# Altium integrated library WE_WR-PHD_Socket Header_2.54mm_rev15c.IntLib: 197 symbols (part 2 of 2) (continued)
## WE-2.54 mm Socket Header 613032243121 (continued)
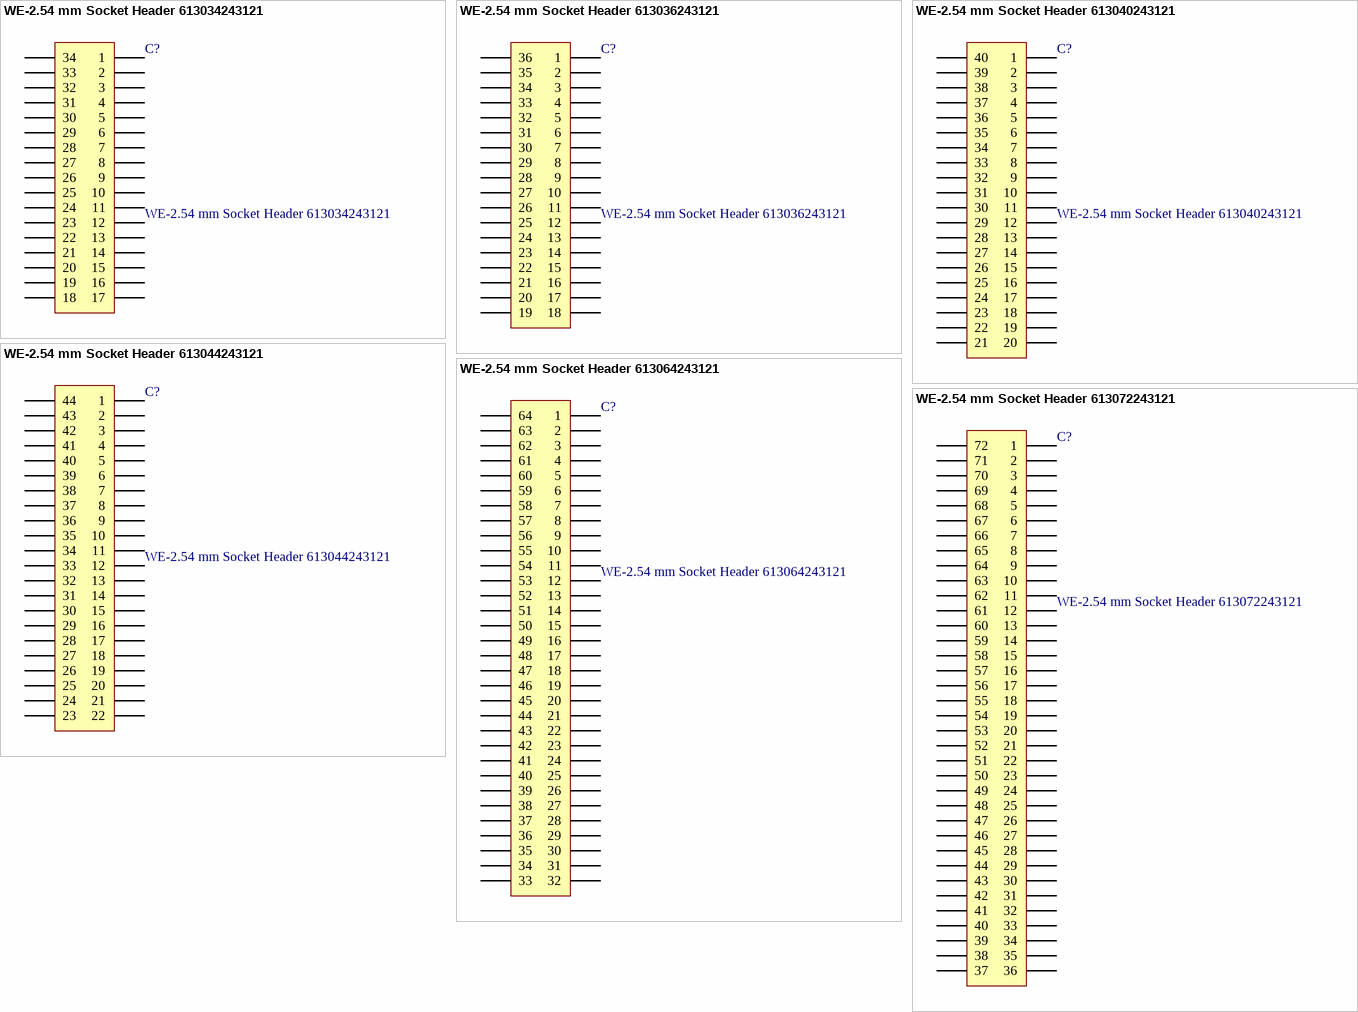
[diagram p15: symbols WE-2.54 mm Socket Header 613034243121 to WE-2.54 mm Socket Header 613072243121]

## WE-2.54 mm Socket Header 613034243121
designator C?
WR-PHD 2.54 mm Angled Socket Header; Manufacturer: Würth Elektronik eiSos GmbH; ComponentLink1 Description: Manufacturer; ComponentLink2 Description: Datasheet; NoPins: 34; Created Date: 29 March 2013; partNo: 613034243121; ComponentLink1URL: http://www.we-online.com; ComponentLink2URL: http://katalog.we-online.de/em/datasheet/6130xx243121.pdf; Created by: Karrer Zheng
footprint 613034243121 (34p 2 rows Right angle)
pins: 1, 2, 3, 4, 5, 6, 7, 8, 9, 10, 11, 12, 13, 14, 15, 16, 17, 18, 19, 20, 21, 22, 23, 24, 25, 26, 27, 28, 29, 30, 31, 32, 33, 34

## WE-2.54 mm Socket Header 613036243121
designator C?
WR-PHD 2.54 mm Angled Socket Header; Manufacturer: Würth Elektronik eiSos GmbH; ComponentLink1 Description: Manufacturer; ComponentLink2 Description: Datasheet; NoPins: 36; Created Date: 29 March 2013; partNo: 613036243121; ComponentLink1URL: http://www.we-online.com; ComponentLink2URL: http://katalog.we-online.de/em/datasheet/6130xx243121.pdf; Created by: Karrer Zheng
footprint 613036243121 (36p 2 rows Right angle)
pins: 1, 2, 3, 4, 5, 6, 7, 8, 9, 10, 11, 12, 13, 14, 15, 16, 17, 18, 19, 20, 21, 22, 23, 24, 25, 26, 27, 28, 29, 30, 31, 32, 33, 34, 35, 36

## WE-2.54 mm Socket Header 613040243121
designator C?
WR-PHD 2.54 mm Angled Socket Header; Manufacturer: Würth Elektronik eiSos GmbH; ComponentLink1 Description: Manufacturer; ComponentLink2 Description: Datasheet; NoPins: 40; Created Date: 29 March 2013; partNo: 613040243121; ComponentLink1URL: http://www.we-online.com; ComponentLink2URL: http://katalog.we-online.de/em/datasheet/6130xx243121.pdf; Created by: Karrer Zheng
footprint 613040243121 (40p 2 rows Right angle)
pins: 1, 2, 3, 4, 5, 6, 7, 8, 9, 10, 11, 12, 13, 14, 15, 16, 17, 18, 19, 20, 21, 22, 23, 24, 25, 26, 27, 28, 29, 30, 31, 32, 33, 34, 35, 36, 37, 38, 39, 40

## WE-2.54 mm Socket Header 613044243121
designator C?
WR-PHD 2.54 mm Angled Socket Header; Manufacturer: Würth Elektronik eiSos GmbH; ComponentLink1 Description: Manufacturer; ComponentLink2 Description: Datasheet; NoPins: 44; Created Date: 29 March 2013; partNo: 613044243121; ComponentLink1URL: http://www.we-online.com; ComponentLink2URL: http://katalog.we-online.de/em/datasheet/6130xx243121.pdf; Created by: Karrer Zheng
footprint 613044243121 (44p 2 rows Right angle)
pins: 1, 2, 3, 4, 5, 6, 7, 8, 9, 10, 11, 12, 13, 14, 15, 16, 17, 18, 19, 20, 21, 22, 23, 24, 25, 26, 27, 28, 29, 30, 31, 32, 33, 34, 35, 36, 37, 38, 39, 40, 41, 42, 43, 44

## WE-2.54 mm Socket Header 613064243121
designator C?
WR-PHD 2.54 mm Angled Socket Header; Manufacturer: Würth Elektronik eiSos GmbH; ComponentLink1 Description: Manufacturer; ComponentLink2 Description: Datasheet; NoPins: 64; Created Date: 29 March 2013; partNo: 613064243121; ComponentLink1URL: http://www.we-online.com; ComponentLink2URL: http://katalog.we-online.de/em/datasheet/6130xx243121.pdf; Created by: Karrer Zheng
footprint 613064243121 (64p 2 rows Right angle)
pins: 1, 2, 3, 4, 5, 6, 7, 8, 9, 10, 11, 12, 13, 14, 15, 16, 17, 18, 19, 20, 21, 22, 23, 24, 25, 26, 27, 28, 29, 30, 31, 32, 33, 34, 35, 36, 37, 38, 39, 40, 41, 42, 43, 44, 45, 46, 47, 48, 49, 50, 51, 52, 53, 54, 55, 56, 57, 58, 59, 60, 61, 62, 63, 64

## WE-2.54 mm Socket Header 613072243121
designator C?
WR-PHD 2.54 mm Angled Socket Header; Manufacturer: Würth Elektronik eiSos GmbH; ComponentLink1 Description: Manufacturer; ComponentLink2 Description: Datasheet; NoPins: 72; Created Date: 29 March 2013; partNo: 613072243121; ComponentLink1URL: http://www.we-online.com; ComponentLink2URL: http://katalog.we-online.de/em/datasheet/6130xx243121.pdf; Created by: Karrer Zheng
footprint 613072243121 (72p 2 rows Right angle)
pins: 1, 2, 3, 4, 5, 6, 7, 8, 9, 10, 11, 12, 13, 14, 15, 16, 17, 18, 19, 20, 21, 22, 23, 24, 25, 26, 27, 28, 29, 30, 31, 32, 33, 34, 35, 36, 37, 38, 39, 40, 41, 42, 43, 44, 45, 46, 47, 48, 49, 50, 51, 52, 53, 54, 55, 56, 57, 58, 59, 60, 61, 62, 63, 64, 65, 66, 67, 68, 69, 70, 71, 72


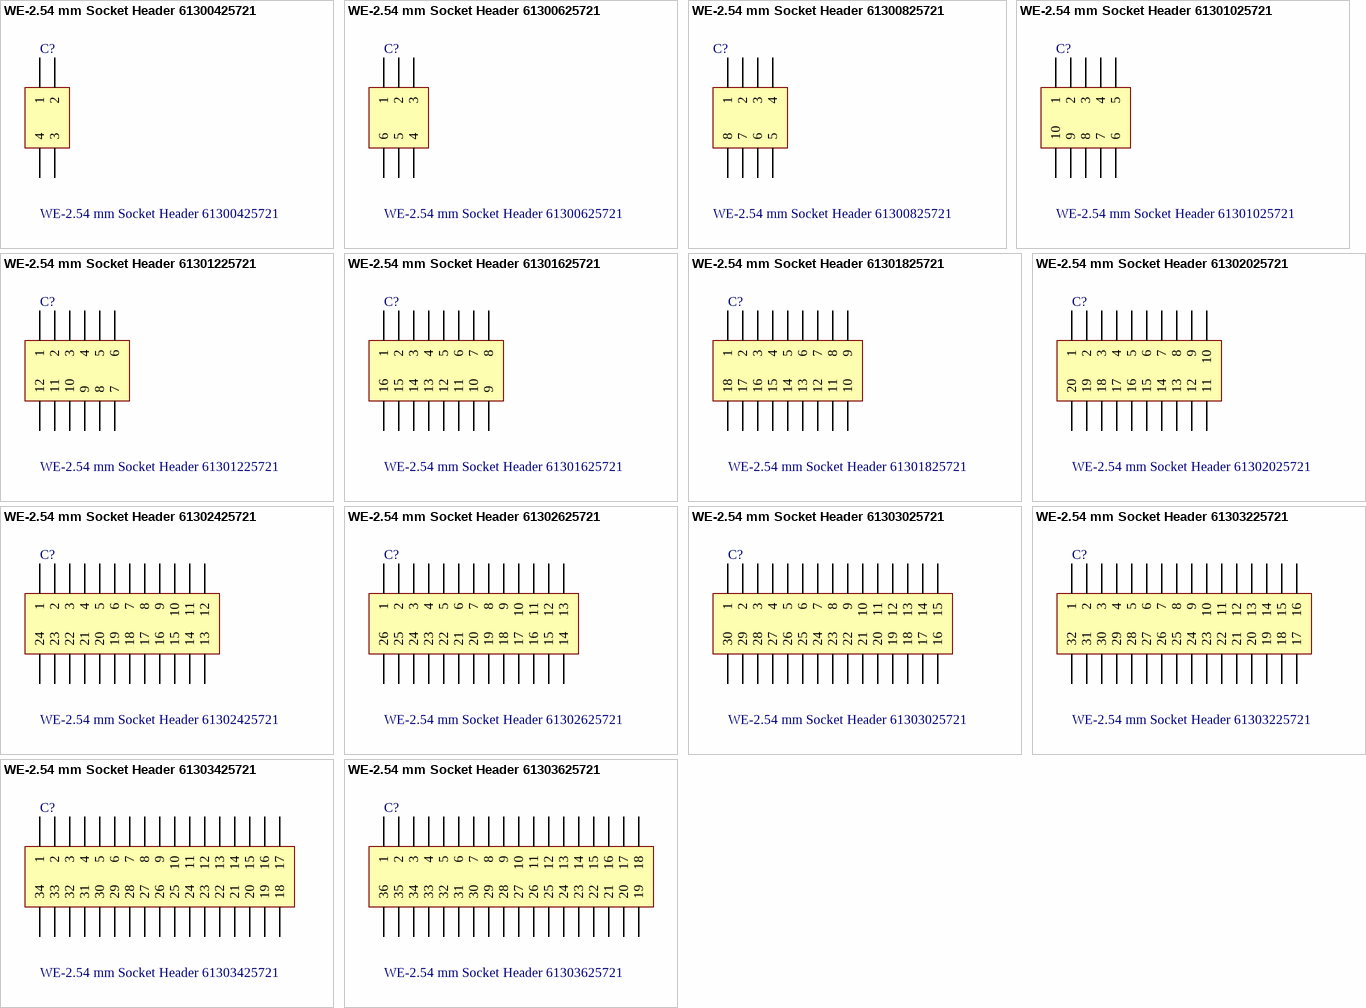
[diagram p16: symbols WE-2.54 mm Socket Header 61300425721 to WE-2.54 mm Socket Header 61303625721]

## WE-2.54 mm Socket Header 61300425721
designator C?
WR-PHD 2.54 mm Dual Socket Header Bottom Entry; Manufacturer: Würth Elektronik eiSos GmbH; ComponentLink1 Description: Manufacturer; ComponentLink2 Description: Datasheet; NoPins: 04; Created Date: 29 March 2013; partNo: 61300425721; ComponentLink1URL: http://www.we-online.com; ComponentLink2URL: http://katalog.we-online.de/em/datasheet/6130xx25721.pdf; Created by: Karrer Zheng
footprint 61300425721 (4 pins, dual row, straight, gold plating)
pins: 1, 2, 3, 4

## WE-2.54 mm Socket Header 61300625721
designator C?
WR-PHD 2.54 mm Dual Socket Header Bottom Entry; Manufacturer: Würth Elektronik eiSos GmbH; ComponentLink1 Description: Manufacturer; ComponentLink2 Description: Datasheet; NoPins: 06; Created Date: 29 March 2013; partNo: 61300625721; ComponentLink1URL: http://www.we-online.com; ComponentLink2URL: http://katalog.we-online.de/em/datasheet/6130xx25721.pdf; Created by: Karrer Zheng
footprint 61300625721 (6 pins, dual row, straight, gold plating)
pins: 1, 2, 3, 4, 5, 6

## WE-2.54 mm Socket Header 61300825721
designator C?
WR-PHD 2.54 mm Dual Socket Header Bottom Entry; Manufacturer: Würth Elektronik eiSos GmbH; ComponentLink1 Description: Manufacturer; ComponentLink2 Description: Datasheet; NoPins: 08; Created Date: 29 March 2013; partNo: 61300825721; ComponentLink1URL: http://www.we-online.com; ComponentLink2URL: http://katalog.we-online.de/em/datasheet/6130xx25721.pdf; Created by: Karrer Zheng
footprint 61300825721 (8 pins, dual row, straight, gold plating)
pins: 1, 2, 3, 4, 5, 6, 7, 8

## WE-2.54 mm Socket Header 61301025721
designator C?
WR-PHD 2.54 mm Dual Socket Header Bottom Entry; Manufacturer: Würth Elektronik eiSos GmbH; ComponentLink1 Description: Manufacturer; ComponentLink2 Description: Datasheet; NoPins: 10; Created Date: 29 March 2013; partNo: 61301025721; ComponentLink1URL: http://www.we-online.com; ComponentLink2URL: http://katalog.we-online.de/em/datasheet/6130xx25721.pdf; Created by: Karrer Zheng
footprint 61301025721 (10 pins, dual row, straight, gold plating)
pins: 1, 2, 3, 4, 5, 6, 7, 8, 9, 10

## WE-2.54 mm Socket Header 61301225721
designator C?
WR-PHD 2.54 mm Dual Socket Header Bottom Entry; Manufacturer: Würth Elektronik eiSos GmbH; ComponentLink1 Description: Manufacturer; ComponentLink2 Description: Datasheet; NoPins: 12; Created Date: 29 March 2013; partNo: 61301225721; ComponentLink1URL: http://www.we-online.com; ComponentLink2URL: http://katalog.we-online.de/em/datasheet/6130xx25721.pdf; Created by: Karrer Zheng
footprint 61301225721 (12 pins, dual row, straight, gold plating)
pins: 1, 2, 3, 4, 5, 6, 7, 8, 9, 10, 11, 12

## WE-2.54 mm Socket Header 61301625721
designator C?
WR-PHD 2.54 mm Dual Socket Header Bottom Entry; Manufacturer: Würth Elektronik eiSos GmbH; ComponentLink1 Description: Manufacturer; ComponentLink2 Description: Datasheet; NoPins: 16; Created Date: 11/8/2014; partNo: 61301625721; ComponentLink1URL: http://www.we-online.com; ComponentLink2URL: http://katalog.we-online.de/em/datasheet/6130xx25721.pdf; Created by: Karrer Zheng
footprint 61301625721 (16 pins, dual row, straight, gold plating)
pins: 1, 2, 3, 4, 5, 6, 7, 8, 9, 10, 11, 12, 13, 14, 15, 16

## WE-2.54 mm Socket Header 61301825721
designator C?
WR-PHD 2.54 mm Dual Socket Header Bottom Entry; Manufacturer: Würth Elektronik eiSos GmbH; ComponentLink1 Description: Manufacturer; ComponentLink2 Description: Datasheet; NoPins: 18; Created Date: 29 March 2013; partNo: 61301825721; ComponentLink1URL: http://www.we-online.com; ComponentLink2URL: http://katalog.we-online.de/em/datasheet/6130xx25721.pdf; Created by: Karrer Zheng
footprint 61301825721 (18 pins, dual row, straight, gold plating)
pins: 1, 2, 3, 4, 5, 6, 7, 8, 9, 10, 11, 12, 13, 14, 15, 16, 17, 18

## WE-2.54 mm Socket Header 61302025721
designator C?
WR-PHD 2.54 mm Dual Socket Header Bottom Entry; Manufacturer: Würth Elektronik eiSos GmbH; ComponentLink1 Description: Manufacturer; ComponentLink2 Description: Datasheet; NoPins: 20; Created Date: 29 March 2013; partNo: 61302025721; ComponentLink1URL: http://www.we-online.com; ComponentLink2URL: http://katalog.we-online.de/em/datasheet/6130xx25721.pdf; Created by: Karrer Zheng
footprint 61302025721 (20 pins, dual row, straight, gold plating)
pins: 1, 2, 3, 4, 5, 6, 7, 8, 9, 10, 11, 12, 13, 14, 15, 16, 17, 18, 19, 20

## WE-2.54 mm Socket Header 61302425721
designator C?
WR-PHD 2.54 mm Dual Socket Header Bottom Entry; Manufacturer: Würth Elektronik eiSos GmbH; ComponentLink1 Description: Manufacturer; ComponentLink2 Description: Datasheet; NoPins: 24; Created Date: 29 March 2013; partNo: 61302425721; ComponentLink1URL: http://www.we-online.com; ComponentLink2URL: http://katalog.we-online.de/em/datasheet/6130xx25721.pdf; Created by: Karrer Zheng
footprint 61302425721 (24 pins, dual row, straight, gold plating)
pins: 1, 2, 3, 4, 5, 6, 7, 8, 9, 10, 11, 12, 13, 14, 15, 16, 17, 18, 19, 20, 21, 22, 23, 24

## WE-2.54 mm Socket Header 61302625721
designator C?
WR-PHD 2.54 mm Dual Socket Header Bottom Entry; Manufacturer: Würth Elektronik eiSos GmbH; ComponentLink1 Description: Manufacturer; ComponentLink2 Description: Datasheet; NoPins: 26; Created Date: 29 March 2013; partNo: 61302625721; ComponentLink1URL: http://www.we-online.com; ComponentLink2URL: http://katalog.we-online.de/em/datasheet/6130xx25721.pdf; Created by: Karrer Zheng
footprint 61302625721 (26 pins, dual row, straight, gold plating)
pins: 1, 2, 3, 4, 5, 6, 7, 8, 9, 10, 11, 12, 13, 14, 15, 16, 17, 18, 19, 20, 21, 22, 23, 24, 25, 26

## WE-2.54 mm Socket Header 61303025721
designator C?
WR-PHD 2.54 mm Dual Socket Header Bottom Entry; Manufacturer: Würth Elektronik eiSos GmbH; ComponentLink1 Description: Manufacturer; ComponentLink2 Description: Datasheet; NoPins: 30; Created Date: 29 March 2013; partNo: 61303025721; ComponentLink1URL: http://www.we-online.com; ComponentLink2URL: http://katalog.we-online.de/em/datasheet/6130xx25721.pdf; Created by: Karrer Zheng
footprint 61303025721 (30 pins, dual row, straight, gold plating)
pins: 1, 2, 3, 4, 5, 6, 7, 8, 9, 10, 11, 12, 13, 14, 15, 16, 17, 18, 19, 20, 21, 22, 23, 24, 25, 26, 27, 28, 29, 30

## WE-2.54 mm Socket Header 61303225721
designator C?
WR-PHD 2.54 mm Dual Socket Header Bottom Entry; Manufacturer: Würth Elektronik eiSos GmbH; ComponentLink1 Description: Manufacturer; ComponentLink2 Description: Datasheet; NoPins: 32; Created Date: 29 March 2013; partNo: 61303225721; ComponentLink1URL: http://www.we-online.com; ComponentLink2URL: http://katalog.we-online.de/em/datasheet/6130xx25721.pdf; Created by: Karrer Zheng
footprint 61303225721 (32 pins, dual row, straight, gold plating)
pins: 1, 2, 3, 4, 5, 6, 7, 8, 9, 10, 11, 12, 13, 14, 15, 16, 17, 18, 19, 20, 21, 22, 23, 24, 25, 26, 27, 28, 29, 30, 31, 32

## WE-2.54 mm Socket Header 61303425721
designator C?
WR-PHD 2.54 mm Dual Socket Header Bottom Entry; Manufacturer: Würth Elektronik eiSos GmbH; ComponentLink1 Description: Manufacturer; ComponentLink2 Description: Datasheet; NoPins: 34; Created Date: 29 March 2013; partNo: 61303425721; ComponentLink1URL: http://www.we-online.com; ComponentLink2URL: http://katalog.we-online.de/em/datasheet/6130xx25721.pdf; Created by: Karrer Zheng
footprint 61303425721 (34 pins, dual row, straight, gold plating)
pins: 1, 2, 3, 4, 5, 6, 7, 8, 9, 10, 11, 12, 13, 14, 15, 16, 17, 18, 19, 20, 21, 22, 23, 24, 25, 26, 27, 28, 29, 30, 31, 32, 33, 34

## WE-2.54 mm Socket Header 61303625721
designator C?
WR-PHD 2.54 mm Dual Socket Header Bottom Entry; Manufacturer: Würth Elektronik eiSos GmbH; ComponentLink1 Description: Manufacturer; ComponentLink2 Description: Datasheet; NoPins: 36; Created Date: 29 March 2013; partNo: 61303625721; ComponentLink1URL: http://www.we-online.com; ComponentLink2URL: http://katalog.we-online.de/em/datasheet/6130xx25721.pdf; Created by: Karrer Zheng
footprint 61303625721 (36 pins, dual row, straight, gold plating)
pins: 1, 2, 3, 4, 5, 6, 7, 8, 9, 10, 11, 12, 13, 14, 15, 16, 17, 18, 19, 20, 21, 22, 23, 24, 25, 26, 27, 28, 29, 30, 31, 32, 33, 34, 35, 36


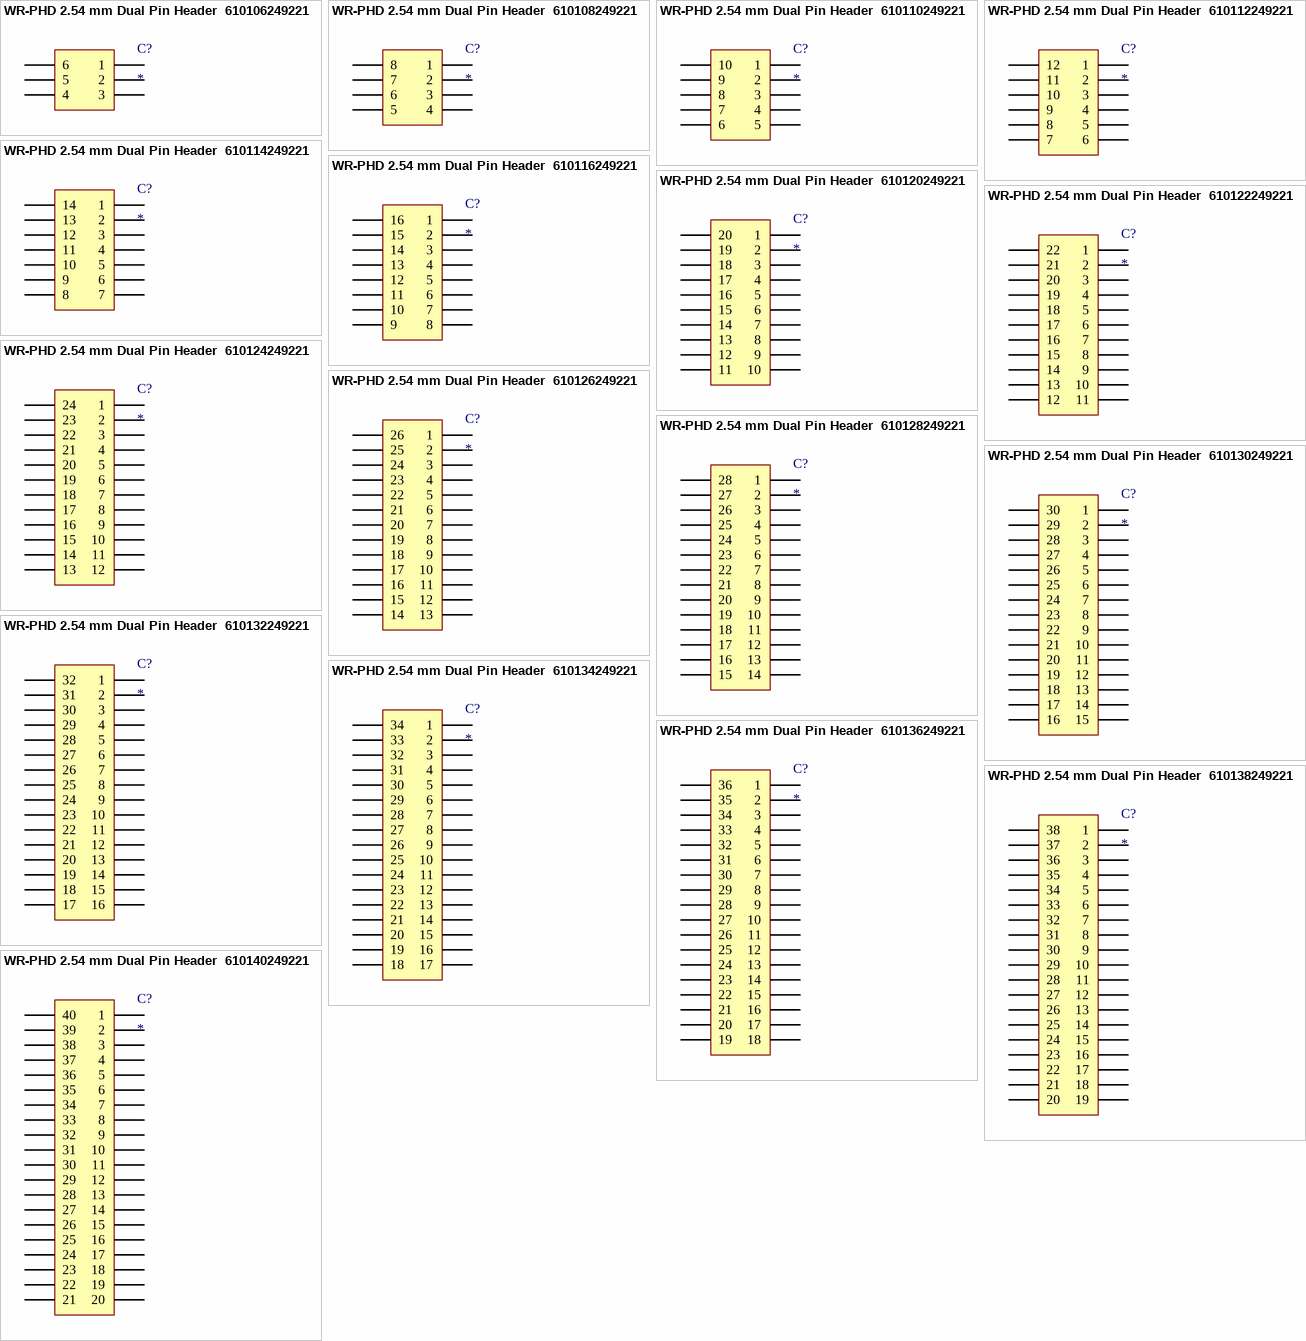
[diagram p17: symbols WR-PHD 2.54 mm Dual Pin Header  610106249221 to WR-PHD 2.54 mm Dual Pin Header  610140249221]

## WR-PHD 2.54 mm Dual Pin Header  610106249221
designator C?
WR-PHD 2.54 mm Dual Socket Header; Manufacturer: Würth Elektronik eiSos GmbH; partNo: 610106249221; ComponentLink1 Description: Manufacturer; ComponentLink2 Description: Datasheet; NoPins: 6; ComponentLink1URL: http://www.we-online.de; ComponentLink2URL: http://katalog.we-online.de/em/datasheet/6101xx249221.pdf; Created by: Karrer Zheng; Created Date: 10/9/2014
footprint 610106249221
pins: 1, 2, 3, 4, 5, 6

## WR-PHD 2.54 mm Dual Pin Header  610108249221
designator C?
WR-PHD 2.54 mm Dual Socket Header; Manufacturer: Würth Elektronik eiSos GmbH; partNo: 610108249221; ComponentLink1 Description: Manufacturer; ComponentLink2 Description: Datasheet; NoPins: 8; ComponentLink1URL: http://www.we-online.de; ComponentLink2URL: http://katalog.we-online.de/em/datasheet/6101xx249221.pdf; Created by: Karrer Zheng; Created Date: 10/9/2014
footprint 610108249221
pins: 1, 2, 3, 4, 5, 6, 7, 8

## WR-PHD 2.54 mm Dual Pin Header  610110249221
designator C?
WR-PHD 2.54 mm Dual Socket Header; Manufacturer: Würth Elektronik eiSos GmbH; partNo: 610110249221; ComponentLink1 Description: Manufacturer; ComponentLink2 Description: Datasheet; NoPins: 10; ComponentLink1URL: http://www.we-online.de; ComponentLink2URL: http://katalog.we-online.de/em/datasheet/6101xx249221.pdf; Created by: Karrer Zheng; Created Date: 10/9/2014
footprint 610110249221
pins: 1, 2, 3, 4, 5, 6, 7, 8, 9, 10

## WR-PHD 2.54 mm Dual Pin Header  610112249221
designator C?
WR-PHD 2.54 mm Dual Socket Header; Manufacturer: Würth Elektronik eiSos GmbH; partNo: 610112249221; ComponentLink1 Description: Manufacturer; ComponentLink2 Description: Datasheet; NoPins: 12; ComponentLink1URL: http://www.we-online.de; ComponentLink2URL: http://katalog.we-online.de/em/datasheet/6101xx249221.pdf; Created by: Karrer Zheng; Created Date: 10/9/2014
footprint 610112249221
pins: 1, 2, 3, 4, 5, 6, 7, 8, 9, 10, 11, 12

## WR-PHD 2.54 mm Dual Pin Header  610114249221
designator C?
WR-PHD 2.54 mm Dual Socket Header; Manufacturer: Würth Elektronik eiSos GmbH; partNo: 610114249221; ComponentLink1 Description: Manufacturer; ComponentLink2 Description: Datasheet; NoPins: 14; ComponentLink1URL: http://www.we-online.de; ComponentLink2URL: http://katalog.we-online.de/em/datasheet/6101xx249221.pdf; Created by: Karrer Zheng; Created Date: 10/9/2014
footprint 610114249221
pins: 1, 2, 3, 4, 5, 6, 7, 8, 9, 10, 11, 12, 13, 14

## WR-PHD 2.54 mm Dual Pin Header  610116249221
designator C?
WR-PHD 2.54 mm Dual Socket Header; Manufacturer: Würth Elektronik eiSos GmbH; partNo: 610116249221; ComponentLink1 Description: Manufacturer; ComponentLink2 Description: Datasheet; NoPins: 16; ComponentLink1URL: http://www.we-online.de; ComponentLink2URL: http://katalog.we-online.de/em/datasheet/6101xx249221.pdf; Created by: Karrer Zheng; Created Date: 10/9/2014
footprint 610116249221
pins: 1, 2, 3, 4, 5, 6, 7, 8, 9, 10, 11, 12, 13, 14, 15, 16

## WR-PHD 2.54 mm Dual Pin Header  610120249221
designator C?
WR-PHD 2.54 mm Dual Socket Header; Manufacturer: Würth Elektronik eiSos GmbH; partNo: 610120249221; ComponentLink1 Description: Manufacturer; ComponentLink2 Description: Datasheet; NoPins: 20; ComponentLink1URL: http://www.we-online.de; ComponentLink2URL: http://katalog.we-online.de/em/datasheet/6101xx249221.pdf; Created by: Karrer Zheng; Created Date: 10/9/2014
footprint 610120249221
pins: 1, 2, 3, 4, 5, 6, 7, 8, 9, 10, 11, 12, 13, 14, 15, 16, 17, 18, 19, 20

## WR-PHD 2.54 mm Dual Pin Header  610122249221
designator C?
WR-PHD 2.54 mm Dual Socket Header; Manufacturer: Würth Elektronik eiSos GmbH; partNo: 610122249221; ComponentLink1 Description: Manufacturer; ComponentLink2 Description: Datasheet; NoPins: 22; ComponentLink1URL: http://www.we-online.de; ComponentLink2URL: http://katalog.we-online.de/em/datasheet/6101xx249221.pdf; Created by: Karrer Zheng; Created Date: 10/9/2014
footprint 610122249221
pins: 1, 2, 3, 4, 5, 6, 7, 8, 9, 10, 11, 12, 13, 14, 15, 16, 17, 18, 19, 20, 21, 22

## WR-PHD 2.54 mm Dual Pin Header  610124249221
designator C?
WR-PHD 2.54 mm Dual Socket Header; Manufacturer: Würth Elektronik eiSos GmbH; partNo: 610124249221; ComponentLink1 Description: Manufacturer; ComponentLink2 Description: Datasheet; NoPins: 24; ComponentLink1URL: http://www.we-online.de; ComponentLink2URL: http://katalog.we-online.de/em/datasheet/6101xx249221.pdf; Created by: Karrer Zheng; Created Date: 10/9/2014
footprint 610124249221
pins: 1, 2, 3, 4, 5, 6, 7, 8, 9, 10, 11, 12, 13, 14, 15, 16, 17, 18, 19, 20, 21, 22, 23, 24

## WR-PHD 2.54 mm Dual Pin Header  610126249221
designator C?
WR-PHD 2.54 mm Dual Socket Header; Manufacturer: Würth Elektronik eiSos GmbH; partNo: 610126249221; ComponentLink1 Description: Manufacturer; ComponentLink2 Description: Datasheet; NoPins: 26; ComponentLink1URL: http://www.we-online.de; ComponentLink2URL: http://katalog.we-online.de/em/datasheet/6101xx249221.pdf; Created by: Karrer Zheng; Created Date: 10/9/2014
footprint 610126249221
pins: 1, 2, 3, 4, 5, 6, 7, 8, 9, 10, 11, 12, 13, 14, 15, 16, 17, 18, 19, 20, 21, 22, 23, 24, 25, 26

## WR-PHD 2.54 mm Dual Pin Header  610128249221
designator C?
WR-PHD 2.54 mm Dual Socket Header; Manufacturer: Würth Elektronik eiSos GmbH; partNo: 610128249221; ComponentLink1 Description: Manufacturer; ComponentLink2 Description: Datasheet; NoPins: 28; ComponentLink1URL: http://www.we-online.de; ComponentLink2URL: http://katalog.we-online.de/em/datasheet/6101xx249221.pdf; Created by: Karrer Zheng; Created Date: 10/9/2014
footprint 610128249221
pins: 1, 2, 3, 4, 5, 6, 7, 8, 9, 10, 11, 12, 13, 14, 15, 16, 17, 18, 19, 20, 21, 22, 23, 24, 25, 26, 27, 28

## WR-PHD 2.54 mm Dual Pin Header  610130249221
designator C?
WR-PHD 2.54 mm Dual Socket Header; Manufacturer: Würth Elektronik eiSos GmbH; partNo: 610130249221; ComponentLink1 Description: Manufacturer; ComponentLink2 Description: Datasheet; NoPins: 30; ComponentLink1URL: http://www.we-online.de; ComponentLink2URL: http://katalog.we-online.de/em/datasheet/6101xx249221.pdf; Created by: Karrer Zheng; Created Date: 10/9/2014
footprint 610130249221
pins: 1, 2, 3, 4, 5, 6, 7, 8, 9, 10, 11, 12, 13, 14, 15, 16, 17, 18, 19, 20, 21, 22, 23, 24, 25, 26, 27, 28, 29, 30

## WR-PHD 2.54 mm Dual Pin Header  610132249221
designator C?
WR-PHD 2.54 mm Dual Socket Header; Manufacturer: Würth Elektronik eiSos GmbH; partNo: 610132249221; ComponentLink1 Description: Manufacturer; ComponentLink2 Description: Datasheet; NoPins: 32; ComponentLink1URL: http://www.we-online.de; ComponentLink2URL: http://katalog.we-online.de/em/datasheet/6101xx249221.pdf; Created by: Karrer Zheng; Created Date: 10/9/2014
footprint 610132249221
pins: 1, 2, 3, 4, 5, 6, 7, 8, 9, 10, 11, 12, 13, 14, 15, 16, 17, 18, 19, 20, 21, 22, 23, 24, 25, 26, 27, 28, 29, 30, 31, 32

## WR-PHD 2.54 mm Dual Pin Header  610134249221
designator C?
WR-PHD 2.54 mm Dual Socket Header; Manufacturer: Würth Elektronik eiSos GmbH; partNo: 610134249221; ComponentLink1 Description: Manufacturer; ComponentLink2 Description: Datasheet; NoPins: 34; ComponentLink1URL: http://www.we-online.de; ComponentLink2URL: http://katalog.we-online.de/em/datasheet/6101xx249221.pdf; Created by: Karrer Zheng; Created Date: 10/9/2014
footprint 610134249221
pins: 1, 2, 3, 4, 5, 6, 7, 8, 9, 10, 11, 12, 13, 14, 15, 16, 17, 18, 19, 20, 21, 22, 23, 24, 25, 26, 27, 28, 29, 30, 31, 32, 33, 34

## WR-PHD 2.54 mm Dual Pin Header  610136249221
designator C?
WR-PHD 2.54 mm Dual Socket Header; Manufacturer: Würth Elektronik eiSos GmbH; partNo: 610136249221; ComponentLink1 Description: Manufacturer; ComponentLink2 Description: Datasheet; NoPins: 36; ComponentLink1URL: http://www.we-online.de; ComponentLink2URL: http://katalog.we-online.de/em/datasheet/6101xx249221.pdf; Created by: Karrer Zheng; Created Date: 10/9/2014
footprint 610136249221
pins: 1, 2, 3, 4, 5, 6, 7, 8, 9, 10, 11, 12, 13, 14, 15, 16, 17, 18, 19, 20, 21, 22, 23, 24, 25, 26, 27, 28, 29, 30, 31, 32, 33, 34, 35, 36

## WR-PHD 2.54 mm Dual Pin Header  610138249221
designator C?
WR-PHD 2.54 mm Dual Socket Header; Manufacturer: Würth Elektronik eiSos GmbH; partNo: 610138249221; ComponentLink1 Description: Manufacturer; ComponentLink2 Description: Datasheet; NoPins: 38; ComponentLink1URL: http://www.we-online.de; ComponentLink2URL: http://katalog.we-online.de/em/datasheet/6101xx249221.pdf; Created by: Karrer Zheng; Created Date: 10/9/2014
footprint 610138249221
pins: 1, 2, 3, 4, 5, 6, 7, 8, 9, 10, 11, 12, 13, 14, 15, 16, 17, 18, 19, 20, 21, 22, 23, 24, 25, 26, 27, 28, 29, 30, 31, 32, 33, 34, 35, 36, 37, 38

## WR-PHD 2.54 mm Dual Pin Header  610140249221
designator C?
WR-PHD 2.54 mm Dual Socket Header; Manufacturer: Würth Elektronik eiSos GmbH; partNo: 610140249221; ComponentLink1 Description: Manufacturer; ComponentLink2 Description: Datasheet; NoPins: 40; ComponentLink1URL: http://www.we-online.de; ComponentLink2URL: http://katalog.we-online.de/em/datasheet/6101xx249221.pdf; Created by: Karrer Zheng; Created Date: 10/9/2014
footprint 610140249221
pins: 1, 2, 3, 4, 5, 6, 7, 8, 9, 10, 11, 12, 13, 14, 15, 16, 17, 18, 19, 20, 21, 22, 23, 24, 25, 26, 27, 28, 29, 30, 31, 32, 33, 34, 35, 36, 37, 38, 39, 40